# Altium footprint library PCB_Lib_Devzone.PcbLib: 491 footprints (part 22 of 31)
Each footprint in its own frame and in the unit in brackets; x right, y up, seen from the top. Pads: shape width x height; smd on the part's side, far side on the other; paste and mask are expansions set on the pad; w line width, h text height; cw(c..) or ccw(c..) is an arc to the next point about the centre after c.
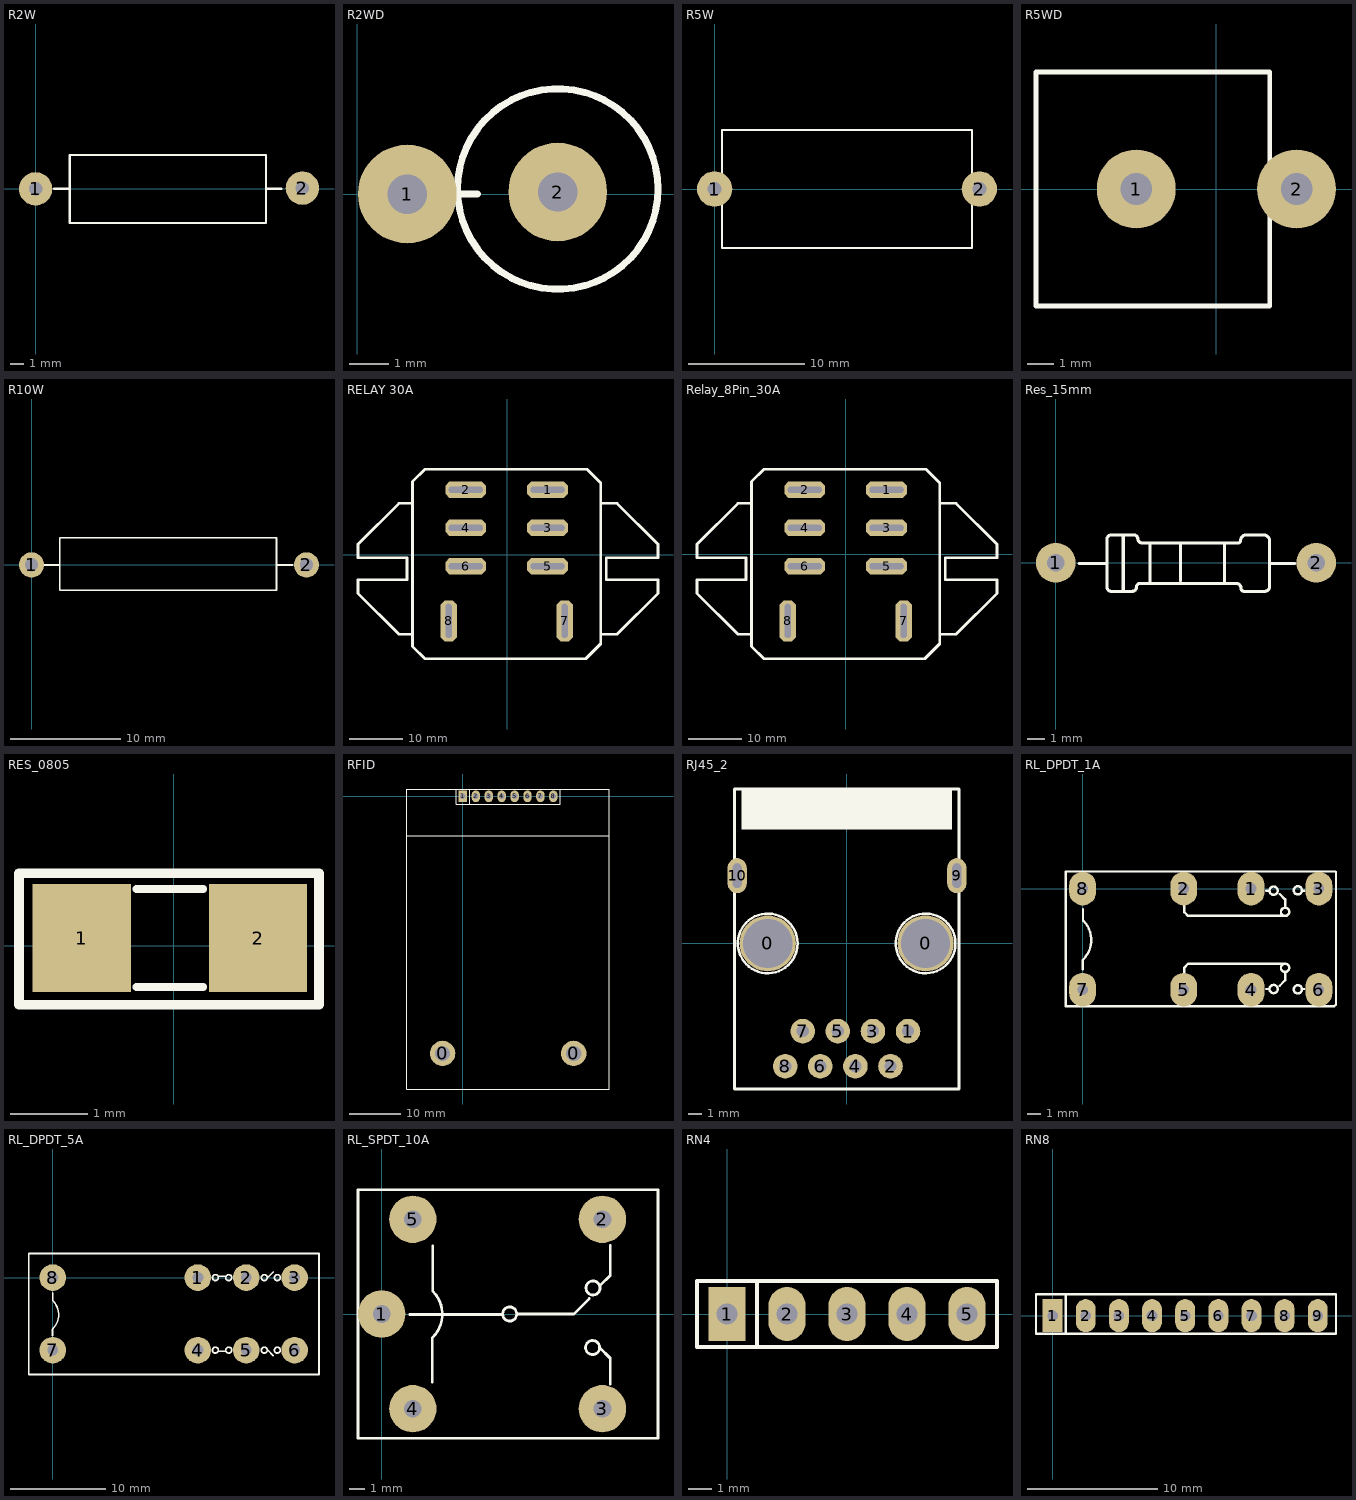
[diagram p21: the footprints below, top view; thin cyan lines are the x and y axes]

## R2W [mm] "R2W, 2 pin, 700mil"
height 5.08
pads (2):
  round 2.5 hole 1: 1(0,0) 2(20,0.051)
Top Overlay:
  lines w0.178: 1.372,0 2.565,0 ; 17.348,0 18.415,0 ; 2.565,0 2.565,2.54 17.272,2.54 17.272,-2.565 2.565,-2.565 2.565,0
3D body "SW3dPS-AXIAL_RESISTOR(3W).STEP": height 8.3, standoff -2, extent -1.108,-3.3 21.092,3.3

## R2WD [mm] "R2W, 2 pin, 700mil"
height 5.08
pads (2):
  round 2.5 hole 1: 1(1.27,0) 2(5.08,0.051)
Top Overlay:
  circle w0.178: c5.08,0.127 r2.54
  lines w0.178: 2.159,0 3.048,0

## R5W [mil] "R5W , 2 pin, 400 x 950mil"
height 400
pads (2):
  round 120 hole 47.24: 1(0,0) 2(900,0)
Top Overlay:
  lines w7: 25,-200 875,-200 875,200 25,200 25,-200
3D body "User Library-5W Resistor.STEP": height 362.6, standoff -98.43, extent -84.69,-190 954.68,191.89

## R5WD [mm] "R5W , 2 pin, 300 x 600 mil"
height 10.16
pads (2):
  round 3 hole 1.2: 1(-3.048,0) 2(3.048,0)
Top Overlay:
  lines w0.178: -6.858,-4.445 2.032,-4.445 2.032,4.445 -6.858,4.445 -6.858,-4.445
3D body "SW3dPS-5W Res.STEP": height 23.05, standoff -2.4, extent -8.648,-5.08 4.432,4.92

## R10W [mil]
pads (2):
  round 90 hole 47.24: 1(0,0) 2(984.25,0)
Top Overlay:
  lines w7: 46,0 101,0 ; 878,0 935,0 ; 101,0 101,97 877,97 877,-91 101,-91 101,0

## RELAY 30A [mil]
pads (8):
  oct 300x120 hole 45 slot 250 at 0 deg: 1(296,476) 2(-304,476) 3(296,196) 4(-304,196) 5(296,-86) 6(-304,-86)
  oct 120x300 hole 45 slot 250 at 90 deg: 7(421,-486) 8(-429,-486)
Top Overlay:
  lines w20: -694,-674 -604,-764 576,-764 686,-654 686,526 586,626 -604,626 -694,536 -694,-664 ; -694,-584 -794,-584 -1094,-284 -1094,-184 -734,-184 -734,-24 -1094,-24 -1094,76 -794,376 -694,376 ; 686,-584 806,-584 1106,-284 1106,-184 726,-184 726,-24 1106,-24 1106,76 806,376 686,376

## Relay_8Pin_30A [mil]
pads (8):
  oct 300x120 hole 45 slot 250 at 0 deg: 1(300,474) 2(-300,474) 3(300,194) 4(-300,194) 5(300,-88) 6(-300,-88)
  oct 120x300 hole 45 slot 250 at 90 deg: 7(425,-488) 8(-425,-488)
Top Overlay:
  lines w20: -690,-586 -790,-586 -1090,-286 -1090,-186 -730,-186 -730,-26 -1090,-26 -1090,74 -790,374 ; 680,-666 690,-656 ; 690,-586 810,-586 1110,-286 1110,-186 ; 690,374 810,374 1110,74 1110,-26 ; 990,-186 1110,-186 ; 990,-26 1110,-26 ; -790,374 -690,374 -790,374 ; 690,-656 580,-766 -600,-766 -690,-676 -690,-666 -690,534 -600,624 590,624 690,524 690,-656 ; 1110,-186 730,-186 730,-26 1110,-26
3D body: height 275.59, standoff 0

## Res_15mm [mil]
pads (2):
  round 90 hole 39.37: 1(0,0) 2(590.55,0)
Top Overlay:
  lines w7: 53,-2 116,-2 ; 126.5,63 177,63 cw(c177,54) 186,54 ccw(c195,54) 195,45 414,45 ccw(c414,50) 419,50 cw(c432,50) 432,63 471,63 cw(c471,49) 485,49 485,-54 cw(c474,-54) 474,-65 ; 127,63 126,63 ccw(c126,53) 116,53 116,-2 ; 153,-63 153,61 ; 214,-45 214,42 ; 283,-42 283,45 ; 383,-47 383,45 ; 487,-2 542,-2 ; 116,-2 116,-55 ccw(c126,-55) 126,-65 ; 126,-65 173,-65 ; 126,-65 173,-65 ; 173,-65 ccw(c173,-55) 183,-55 cw(c191,-55) 191,-47 409,-47 cw(c409,-58) 420,-58 ccw(c427,-58) 427,-65 ; 427,-65 474,-65 ; 427,-65 474,-65

## RES_0805 [mil]
pads (2):
  rect 50x55 smd: 1(-47,4) 2(43,4)
Top Overlay:
  lines w4: -19,-21 15,-21 ; -19,29 15,29
  lines w5: -79,-30 -79,37 74,37 74,-30 -79,-30
3D body "User Library-Res_Vishay_CRCW0805_2012.STEP": height 17.76, standoff 0, extent -43.37,-20.6 35.37,28.61

## RFID [mil]
pads (10):
  round 196.85 hole 118.11: 0(-157.48,-1990.24) 0(857.48,-1990.24)
  rect 65x90 hole 42: 1(0,0)
  oval 65x90 hole 42: 2(100,0) 3(200,0) 4(300,0) 5(400,0) 6(500,0) 7(600,0) 8(700,0)
Top Overlay:
  lines w7: -435.14,-305 1131,-305 ; -52,57 -52,-60 752,-60 752,57 ; 51,-60 51,56 ; -433.07,-2265.83 1133.07,-2265.83 1133.07,57 -433.07,57 -433.07,-2265.83
3D body "JP1-8.stp": height 323.43, standoff -117.51, extent -48.03,-50 748.03,48.43

## RJ45_2 [mil]
pads (12):
  round 160 hole 140: 0(-225,0) 0(225,0)
  round 70 hole 35: 1(175,-250) 2(125,-350) 3(75,-250) 4(25,-350) 5(-25,-250) 6(-75,-350) 7(-125,-250) 8(-175,-350)
  oval 55x100 hole 25 slot 70 at 90 deg: 9(314,193) 10(-312,193)
Top Overlay:
  circle w7: c225,0 r85
  circle w7: c-225,0 r85
  rectangle: -300,325 300,440
  lines w8: -320,-70 -320,440 320,440 320,-179 ; -320,-67 -320,-415 320,-415 320,-170
3D body "User Library-hr911105.STEP": height 532.1, standoff -117.51, extent -312.6,-410 312.6,432.52

## RL_DPDT_1A [mil] "Reley DPDT, 8 pin, 1A, W400mil, L800mil,H 300mil"
height 300
pads (8):
  oval 80x100 hole 32: 1(500,0) 2(300,0) 3(701,0) 4(500,-300) 5(300,-300) 6(701,-300) 7(0,-300) 8(0,0)
Top Overlay:
  circle w7: c638.76,-299 r12.24
  circle w7: c566.76,-298 r12.24
  circle w7: c600.76,-235 r12.24
  circle w7: c600.76,-69 r12.24
  circle w7: c566.76,-6 r12.24
  circle w7: c638.76,-5 r12.24
  lines w7: 0,-239 0,-212 ; 1,-211 ccw(c-56.5,-152.5) 2,-95 ; 1,-94 1,-61 ; 302,-255 302,-234 313,-223 599,-223 ; 302,-42 302,-70 313,-81 599,-81 ; 544,-298 552,-298 ; 544,-6 552,-6 ; 585,-288 601,-272 601,-249 ; 585,-16 601,-32 601,-55 ; 653,-298 658,-298 ; 653,-6 658,-6 ; -50,-349 -50,51 750,51 752,49 752,-344 747,-349 -50,-349
3D body "SW3dPS-DSY2Y.STEP": height 484.25, standoff -118.11, extent -59.45,-340 759.45,45.83

## RL_DPDT_5A [mil] "Reley DPDT, 8 pin, 5A, W500mil, L1100mil,H 950mil"
height 300
pads (8):
  round 110 hole 45: 1(600,0) 2(800,0) 3(1000,0) 4(600,-300) 5(800,-300) 6(1000,-300) 7(0,-300) 8(0,0)
Top Overlay:
  circle w7: c928.76,0 r12.24
  circle w7: c874.76,0 r12.24
  circle w7: c727.76,0 r12.24
  circle w7: c672.76,0 r12.24
  circle w7: c672.76,-300 r12.24
  circle w7: c727.76,-300 r12.24
  circle w7: c874.76,-300 r12.24
  circle w7: c928.76,-300 r12.24
  lines w7: -1,-240 -1,-213 ; 0,-212 ccw(c-57.5,-153.5) 1,-96 ; 0,-95 0,-62 ; 687,-305 716,-305 ; 687,5 716,5 ; 888,-299 912,-323 ; 888,-1 912,23 ; -99,-401 -99,100 1101,100 1101,-401 -99,-401

## RL_SPDT_10A [mil] "Relay SPDT, 5 pin, 10A,W 650mil, L 800mil, H 800mil"
height 800
pads (5):
  round 120 hole 45: 1(0,0) 2(559.06,240) 3(559.06,-240) 4(78.74,-240) 5(78.74,240)
Top Overlay:
  circle w7: c324.2,0 r17.8
  circle w7: c535.2,66 r17.8
  circle w7: c534.2,-85 r17.8
  lines w7: -60.12,315 -60.12,-315 700,-315 700,315 -60,315 ; 71,-1 304,-1 ; 128,-173 128,-60 ; 129,-59 ccw(c71.5,-0.5) 130,57 ; 129,58 129,172 ; 344,0 487,0 526,39 ; 552,-85 579,-112 579,-178 ; 553,72 579,98 579,174
3D body: height 606.3, standoff 3.94, extent -56,-315 701,315
3D body: height 196.85, standoff -196.85, extent 539.53,220.36 578.75,259.65
3D body: height 196.85, standoff -196.85, extent 539.53,-259.64 578.75,-220.35
3D body: height 196.85, standoff -196.85, extent 59.22,-259.64 98.43,-220.35
3D body: height 196.85, standoff -196.85, extent -19.52,-19.64 19.69,19.65
3D body: height 196.85, standoff -196.85, extent 59.22,220.36 98.43,259.65

## RN4 [mil] "R SIP4, 5 Pin"
height 200
pads (5):
  rect 62x90 hole 35: 1(0,0)
  oval 62x90 hole 35: 2(100,0) 3(200,0) 4(300,0) 5(400,0)
Top Overlay:
  lines w7: 50,-55 50,55 ; -50,-55 -50,55 450,55 450,-55 -50,-55

## RN8 [mil] "R SIP8, 9 Pin"
height 200
pads (9):
  rect 60x100 hole 32: 1(0,0)
  oval 60x100 hole 32: 2(100,0) 3(200,0) 4(300,0) 5(400,0) 6(500,0) 7(600,0) 8(700,0) 9(800,0)
Top Overlay:
  lines w7: 40,-55 40,65 ; -50,-55 855,-55 855,65 -50,65 -50,-55
3D body "SW3dPS-Resistor Networks-1.STEP": height 259.29, standoff -75.35, extent -42.91,-44.21 842.91,5